# Altium footprint library ICs And Semiconductors THD.PcbLib: 507 footprints (part 9 of 32)
Each footprint in its own frame and in the unit in brackets; x right, y up, seen from the top. Pads: shape width x height; smd on the part's side, far side on the other; paste and mask are expansions set on the pad; w line width, h text height; cw(c..) or ccw(c..) is an arc to the next point about the centre after c.
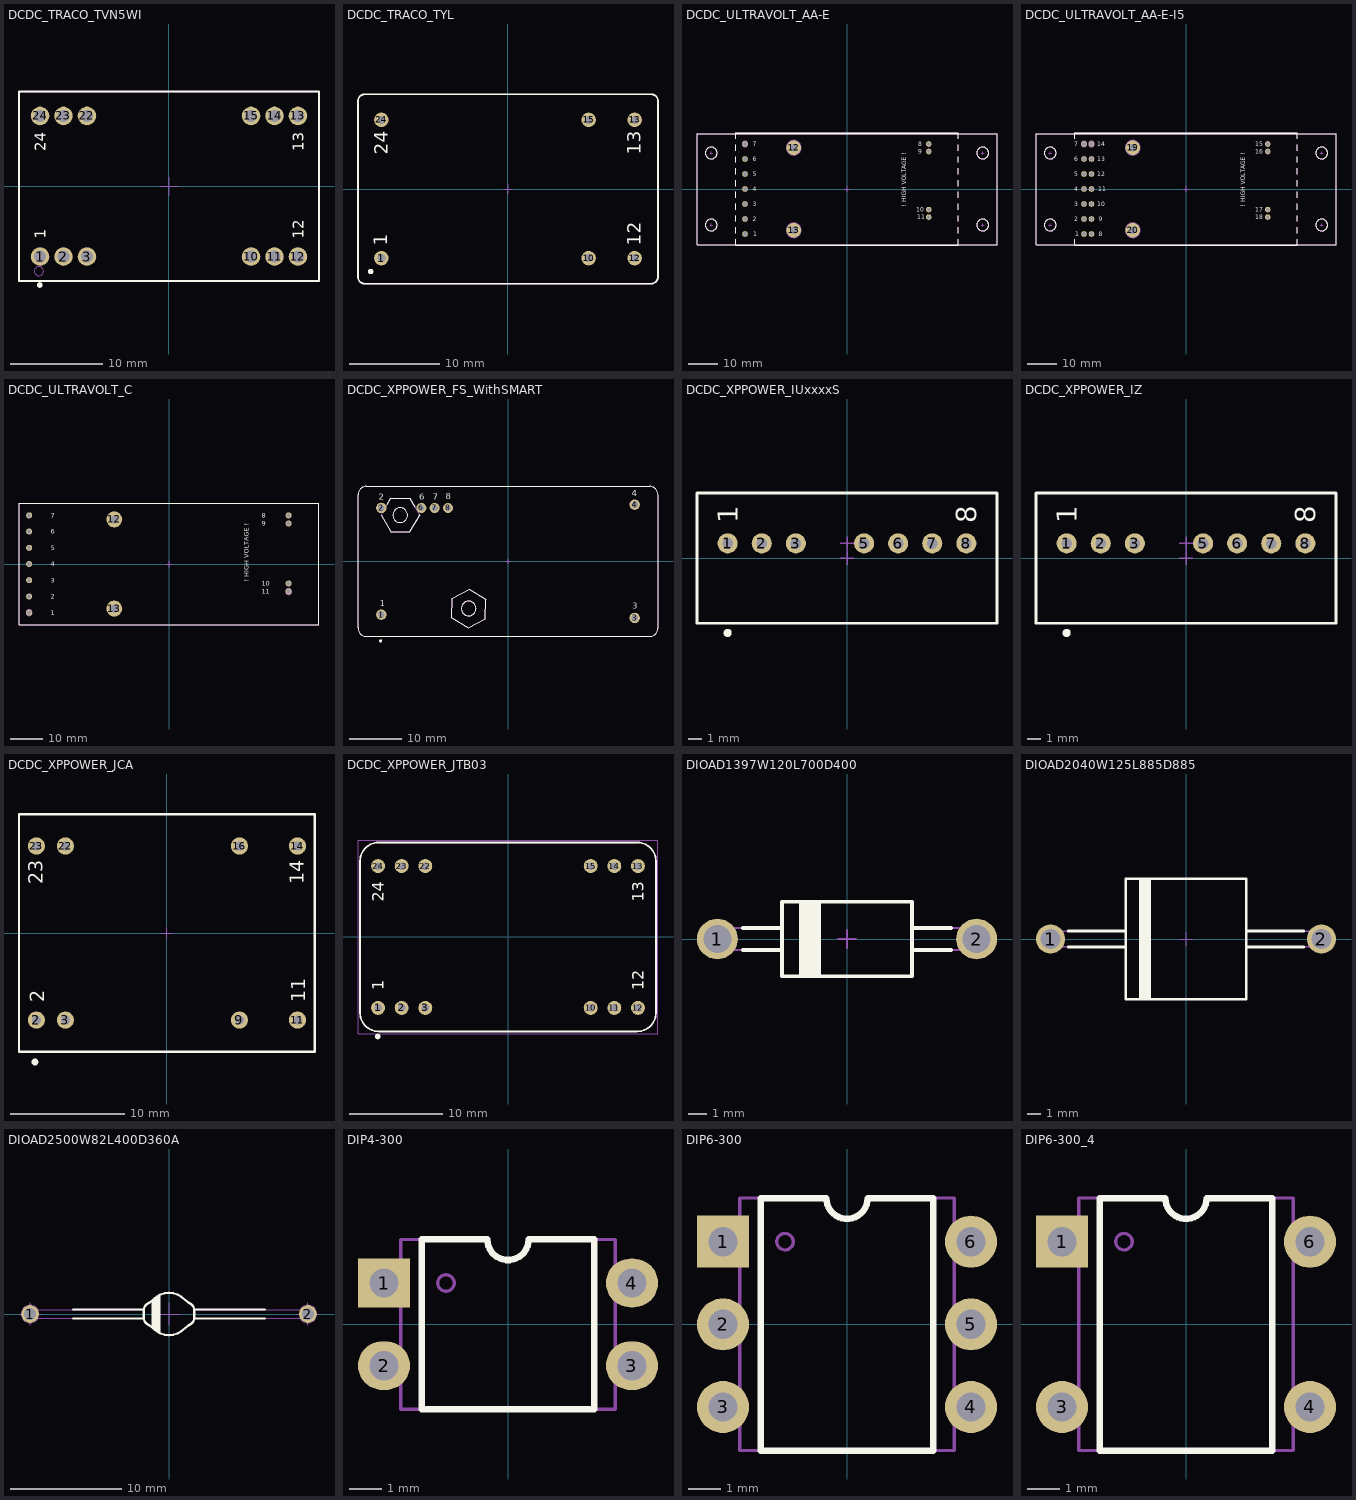
[diagram p8: the footprints below, top view; thin cyan lines are the x and y axes]

## DCDC_TRACO_TVN5WI [mm] "TVN  5WI Series , Body 32x20mm, Pitch 2.54mm"
height 10.7
pads (12):
  round 2 hole 1.3: 1(-13.97,-7.62) 2(-11.43,-7.62) 3(-8.89,-7.62) 10(8.89,-7.62) 11(11.43,-7.62) 12(13.97,-7.62) 13(13.97,7.62) 14(11.43,7.62) 15(8.89,7.62) 22(-8.89,7.62) 23(-11.43,7.62) 24(-13.97,7.62)
Top Overlay:
  circle w0.3: c-14,-10.7 r0.15
  lines w0.2: -16.25,-10.25 -16.25,10.25 16.25,10.25 16.25,-10.25 -16.25,-10.25
  text "1" at -13.335,-5.715 h1.2
  text "13" at 14.605,3.81 h1.2
  text "24" at -13.335,3.81 h1.2
  text "12" at 14.605,-5.715 h1.2
Notvisible:
  lines w0.1: -14.97,-7.62 -13.97,-7.62 ; -14.97,7.62 -13.97,7.62 ; -13.97,-8.62 -13.97,-7.62 ; -13.97,-6.62 -13.97,-7.62 ; -13.97,6.62 -13.97,7.62 ; -13.97,8.62 -13.97,7.62 ; -12.97,-7.62 -13.97,-7.62 ; -12.97,7.62 -13.97,7.62 ; -12.43,-7.62 -11.43,-7.62 ; -12.43,7.62 -11.43,7.62 ; -11.43,-8.62 -11.43,-7.62 ; -11.43,-6.62 -11.43,-7.62 ; -11.43,6.62 -11.43,7.62 ; -11.43,8.62 -11.43,7.62 ; -10.43,-7.62 -11.43,-7.62 ; -10.43,7.62 -11.43,7.62 ; -9.89,-7.62 -8.89,-7.62 ; -9.89,7.62 -8.89,7.62 ; -8.89,-8.62 -8.89,-7.62 ; -8.89,-6.62 -8.89,-7.62 ; -8.89,6.62 -8.89,7.62 ; -8.89,8.62 -8.89,7.62 ; -7.89,-7.62 -8.89,-7.62 ; -7.89,7.62 -8.89,7.62 ; -1,0 0,0 ; 0,-1 0,0 ; 0,1 0,0 ; 1,0 0,0 ; 7.89,-7.62 8.89,-7.62 ; 7.89,7.62 8.89,7.62 ; 8.89,-8.62 8.89,-7.62 ; 8.89,-6.62 8.89,-7.62 ; 8.89,6.62 8.89,7.62 ; 8.89,8.62 8.89,7.62 ; 9.89,-7.62 8.89,-7.62 ; 9.89,7.62 8.89,7.62 ; 10.43,-7.62 11.43,-7.62 ; 10.43,7.62 11.43,7.62 ; 11.43,-8.62 11.43,-7.62 ; 11.43,-6.62 11.43,-7.62 ; 11.43,6.62 11.43,7.62 ; 11.43,8.62 11.43,7.62 ; 12.43,-7.62 11.43,-7.62 ; 12.43,7.62 11.43,7.62 ; 12.97,-7.62 13.97,-7.62 ; 12.97,7.62 13.97,7.62 ; 13.97,-8.62 13.97,-7.62 ; 13.97,-6.62 13.97,-7.62 ; 13.97,6.62 13.97,7.62 ; 13.97,8.62 13.97,7.62 ; 14.97,-7.62 13.97,-7.62 ; 14.97,7.62 13.97,7.62
Mechanical 14:
  circle w0.1: c-14.095,-9.205 r0.5
  lines w0.1: -16.25,-10.25 -16.25,10.25 16.25,10.25 16.25,-10.25 -16.25,-10.25
  text "1" at -13.335,-5.715 h1.2
  text "12" at 14.605,-5.715 h1.2
  text "13" at 14.605,3.81 h1.2
  text "24" at -13.335,3.81 h1.2
3D body "DCDC_TRACO_TVN5WI.stp": height 10.7, standoff -3.8, extent -16.25,-10.25 16.25,10.25

## DCDC_TRACO_TYL [mm] "TYL Series , Body 32.6x20.4mm"
height 10.8
pads (6):
  round 1.6 hole 0.9: 1(-13.97,-7.62) 10(8.89,-7.62) 12(13.97,-7.62) 13(13.97,7.62) 15(8.89,7.62) 24(-13.97,7.62)
Top Overlay:
  circle w0.3: c-15.15,-9.1 r0.15
  lines w0.2: -16.55,-9.7 ccw(c-15.8,-9.7) -15.8,-10.45 15.8,-10.45 ccw(c15.8,-9.7) 16.55,-9.7 16.55,9.7 ccw(c15.8,9.7) 15.8,10.45 -15.8,10.45 ccw(c-15.8,9.7) -16.55,9.7 -16.55,-9.7
  text "24" at -13.29,3.769 h1.5
  text "1" at -13.32,-6.251 h1.5
  text "13" at 14.65,3.769 h1.5
  text "12" at 14.62,-6.251 h1.5
Notvisible:
  lines w0.1: -14.47,-7.62 -13.97,-7.62 ; -14.47,7.62 -13.97,7.62 ; -13.97,-8.12 -13.97,-7.62 ; -13.97,-7.12 -13.97,-7.62 ; -13.97,7.12 -13.97,7.62 ; -13.97,8.12 -13.97,7.62 ; -13.47,-7.62 -13.97,-7.62 ; -13.47,7.62 -13.97,7.62 ; -0.5,0 0,0 ; 0,-0.5 0,0 ; 0,0.5 0,0 ; 0.5,0 0,0 ; 8.39,-7.62 8.89,-7.62 ; 8.39,7.62 8.89,7.62 ; 8.89,-8.12 8.89,-7.62 ; 8.89,-7.12 8.89,-7.62 ; 8.89,7.12 8.89,7.62 ; 8.89,8.12 8.89,7.62 ; 9.39,-7.62 8.89,-7.62 ; 9.39,7.62 8.89,7.62 ; 13.47,-7.62 13.97,-7.62 ; 13.47,7.62 13.97,7.62 ; 13.97,-8.12 13.97,-7.62 ; 13.97,-7.12 13.97,-7.62 ; 13.97,7.12 13.97,7.62 ; 13.97,8.12 13.97,7.62 ; 14.47,-7.62 13.97,-7.62 ; 14.47,7.62 13.97,7.62
Mechanical 14:
  lines w0.1: -16.55,-9.7 ccw(c-15.8,-9.7) -15.8,-10.45 15.8,-10.45 ccw(c15.8,-9.7) 16.55,-9.7 16.55,9.7 ccw(c15.8,9.7) 15.8,10.45 -15.8,10.45 ccw(c-15.8,9.7) -16.55,9.7 -16.55,-9.7
  text "24" at -13.29,3.769 h1.5
  text "1" at -13.32,-6.251 h1.5
  text "13" at 14.65,3.769 h1.5
  text "12" at 14.62,-6.251 h1.5
3D body "DCDC_TRACO_TYL.stp": height 10.8, standoff -3.6, extent -16.55,-10.45 16.55,10.45

## DCDC_ULTRAVOLT_AA-E [mm] "ULTRAVOLT AA Series, DC-DC Converter, with 'Eared' Heat Sink Plate, Body 75.4x38.1mm"
height 22.2
pads (13):
  round 1.9 hole 1.2: 1(-34.544,-15.24) 2(-34.544,-10.16) 3(-34.544,-5.08) 4(-34.544,0) 5(-34.544,5.08) 6(-34.544,10.16) 7(-34.544,15.24) 8(27.686,15.24) 9(27.686,12.7) 10(27.686,-6.985) 11(27.686,-9.525)
  round 5 hole 2.5: 12(-18.034,13.97) 13(-18.034,-13.97)
Top Overlay:
  circle w0.2: c-45.974,-12.192 r1.981
  circle w0.2: c45.974,12.192 r1.981
  circle w0.2: c45.974,-12.192 r1.981
  circle w0.2: c-45.974,12.192 r1.981
  lines w0.2: -37.719,-17 -37.719,-19.05 37.719,-19.05 37.719,-17 ; -37.719,-15 -37.719,-13 ; -37.719,-11 -37.719,-9 ; -37.719,-7 -37.719,-5 ; -37.719,-3 -37.719,-1 ; -37.719,1 -37.719,3 ; -37.719,5 -37.719,7 ; -37.719,9 -37.719,11 ; -37.719,13 -37.719,15 ; -37.719,17 -37.719,19.05 37.719,19.05 37.719,17 ; 37.719,-15 37.719,-13 ; 37.719,-11 37.719,-9 ; 37.719,-7 37.719,-5 ; 37.719,-3 37.719,-1 ; 37.719,1 37.719,3 ; 37.719,5 37.719,7 ; 37.719,9 37.719,11 ; 37.719,13 37.719,15 ; -50.8,-18.796 -50.8,18.796 50.8,18.796 50.8,-18.796 -50.8,-18.796
  text "! HIGH VOLTAGE !" at 20,-6 h1.5
  text "11" at 23.8,-10.275 h1.5
  text "10" at 23.5,-7.735 h1.5
  text "9" at 24.1,11.95 h1.5
  text "8" at 24.1,14.49 h1.5
  text "7" at -32,14.49 h1.5
  text "6" at -32,9.41 h1.5
  text "5" at -32,4.33 h1.5
  text "4" at -32,-0.75 h1.5
  text "3" at -32,-5.83 h1.5
  text "2" at -32,-10.91 h1.5
  text "1" at -31.7,-15.99 h1.5
Notvisible:
  circle w0.05: c-18.034,13.97 r1.1
  circle w0.05: c-18.034,-13.97 r1.1
  circle w0.05: c-34.544,15.24 r0.95
  circle w0.05: c-34.544,15.24 r0.6
  lines w0.05: -46.474,-12.192 -45.974,-12.192 ; -46.474,12.192 -45.974,12.192 ; -45.974,-12.692 -45.974,-12.192 ; -45.974,-11.692 -45.974,-12.192 ; -45.974,11.692 -45.974,12.192 ; -45.974,12.692 -45.974,12.192 ; -45.474,-12.192 -45.974,-12.192 ; -45.474,12.192 -45.974,12.192 ; -35.044,-15.24 -34.544,-15.24 ; -35.044,-10.16 -34.544,-10.16 ; -35.044,-5.08 -34.544,-5.08 ; -35.044,0 -34.544,0 ; -35.044,5.08 -34.544,5.08 ; -35.044,10.16 -34.544,10.16 ; -35.044,15.24 -34.544,15.24 ; -34.544,-15.74 -34.544,-15.24 ; -34.544,-14.74 -34.544,-15.24 ; -34.544,-10.66 -34.544,-10.16 ; -34.544,-9.66 -34.544,-10.16 ; -34.544,-5.58 -34.544,-5.08 ; -34.544,-4.58 -34.544,-5.08 ; -34.544,-0.5 -34.544,0 ; -34.544,0.5 -34.544,0 ; -34.544,4.58 -34.544,5.08 ; -34.544,5.58 -34.544,5.08 ; -34.544,9.66 -34.544,10.16 ; -34.544,10.66 -34.544,10.16 ; -34.544,14.74 -34.544,15.24 ; -34.544,15.74 -34.544,15.24 ; -34.044,-15.24 -34.544,-15.24 ; -34.044,-10.16 -34.544,-10.16 ; -34.044,-5.08 -34.544,-5.08 ; -34.044,0 -34.544,0 ; -34.044,5.08 -34.544,5.08 ; -34.044,10.16 -34.544,10.16 ; -34.044,15.24 -34.544,15.24 ; -18.534,-13.97 -18.034,-13.97 ; -18.534,13.97 -18.034,13.97 ; -18.034,-14.47 -18.034,-13.97 ; -18.034,-13.47 -18.034,-13.97 ; -18.034,13.47 -18.034,13.97 ; -18.034,14.47 -18.034,13.97 ; -17.534,-13.97 -18.034,-13.97 ; -17.534,13.97 -18.034,13.97 ; -1,0 1,0 ; 0,-1 0,1 ; 27.186,-9.525 27.686,-9.525 ; 27.186,-6.985 27.686,-6.985 ; 27.186,12.7 27.686,12.7 ; 27.186,15.24 27.686,15.24 ; 27.686,-10.025 27.686,-9.525 ; 27.686,-9.025 27.686,-9.525 ; 27.686,-7.485 27.686,-6.985 ; 27.686,-6.485 27.686,-6.985 ; 27.686,12.2 27.686,12.7 ; 27.686,13.2 27.686,12.7 ; 27.686,14.74 27.686,15.24 ; 27.686,15.74 27.686,15.24 ; 28.186,-9.525 27.686,-9.525 ; 28.186,-6.985 27.686,-6.985 ; 28.186,12.7 27.686,12.7 ; 28.186,15.24 27.686,15.24 ; 45.474,-12.192 45.974,-12.192 ; 45.474,12.192 45.974,12.192 ; 45.974,-12.692 45.974,-12.192 ; 45.974,-11.692 45.974,-12.192 ; 45.974,11.692 45.974,12.192 ; 45.974,12.692 45.974,12.192 ; 46.474,-12.192 45.974,-12.192 ; 46.474,12.192 45.974,12.192
Mechanical 14:
  circle w0.1: c-18.034,-13.97 r2.35
  circle w0.1: c-18.034,13.97 r2.35
  circle w0.1: c45.974,12.192 r1.981
  circle w0.1: c45.974,-12.192 r1.981
  circle w0.1: c-45.974,-12.192 r1.981
  circle w0.1: c-45.974,12.192 r1.981
  circle w0.1: c-18.034,13.97 r2.5
  circle w0.1: c-18.034,-13.97 r2.5
  lines w0.1: -37.719,-17 -37.719,-19.05 37.719,-19.05 37.719,-17 ; -37.719,-15 -37.719,-13 ; -37.719,-11 -37.719,-9 ; -37.719,-7 -37.719,-5 ; -37.719,-3 -37.719,-1 ; -37.719,1 -37.719,3 ; -37.719,5 -37.719,7 ; -37.719,9 -37.719,11 ; -37.719,13 -37.719,15 ; -37.719,17 -37.719,19.05 37.719,19.05 37.719,17 ; 37.719,-15 37.719,-13 ; 37.719,-11 37.719,-9 ; 37.719,-7 37.719,-5 ; 37.719,-3 37.719,-1 ; 37.719,1 37.719,3 ; 37.719,5 37.719,7 ; 37.719,9 37.719,11 ; 37.719,13 37.719,15 ; -50.8,-18.796 -50.8,18.796 50.8,18.796 50.8,-18.796 -50.8,-18.796
  text "11" at 23.8,-10.275 h1.5
  text "10" at 23.5,-7.735 h1.5
  text "9" at 24.1,11.95 h1.5
  text "8" at 24.1,14.49 h1.5
  text "7" at -32,14.49 h1.5
  text "6" at -32,9.41 h1.5
  text "5" at -32,4.33 h1.5
  text "4" at -32,-0.75 h1.5
  text "3" at -32,-5.83 h1.5
  text "2" at -32,-10.91 h1.5
  text "1" at -31.7,-15.99 h1.5
3D body "DCDC_ULTRAVOLT_AA-E.stp": height 22.2, standoff -3.5, extent -50.8,-19.05 50.8,19.05

## DCDC_ULTRAVOLT_AA-E-I5 [mm] "ULTRAVOLT AA Series, DC-DC Converter, with 'Eared' Heat Sink Plate and I5 Interface, Body 75.4x38.1mm"
height 22.2
pads (20):
  round 1.9 hole 1.2: 1(-34.544,-15.24) 2(-34.544,-10.16) 3(-34.544,-5.08) 4(-34.544,0) 5(-34.544,5.08) 6(-34.544,10.16) 7(-34.544,15.24) 8(-32.004,-15.24) 9(-32.004,-10.16) 10(-32.004,-5.08) 11(-32.004,0) 12(-32.004,5.08) 13(-32.004,10.16) 14(-32.004,15.24) 15(27.686,15.24) 16(27.686,12.7) 17(27.686,-6.985) 18(27.686,-9.525)
  round 5 hole 2.5: 19(-18.034,13.97) 20(-18.034,-13.97)
Top Overlay:
  circle w0.2: c-45.974,12.192 r1.981
  circle w0.2: c45.974,-12.192 r1.981
  circle w0.2: c45.974,12.192 r1.981
  circle w0.2: c-45.974,-12.192 r1.981
  lines w0.2: -37.719,-17 -37.719,-19.05 37.719,-19.05 37.719,-17 ; -37.719,17 -37.719,19.05 37.719,19.05 37.719,17 ; 37.719,-15 37.719,-13 ; 37.719,-11 37.719,-9 ; 37.719,-7 37.719,-5 ; 37.719,-3 37.719,-1 ; 37.719,1 37.719,3 ; 37.719,5 37.719,7 ; 37.719,9 37.719,11 ; 37.719,13 37.719,15 ; -50.8,-18.796 50.8,-18.796 50.8,18.796 -50.8,18.796 -50.8,-18.796
  text "8" at -29.5,-15.99 h1.5
  text "9" at -29.5,-10.91 h1.5
  text "10" at -30,-5.83 h1.5
  text "11" at -29.7,-0.75 h1.5
  text "12" at -30,4.33 h1.5
  text "13" at -30,9.41 h1.5
  text "14" at -30.1,14.49 h1.5
  text "1" at -37.5,-15.99 h1.5
  text "2" at -37.8,-10.91 h1.5
  text "3" at -37.8,-5.83 h1.5
  text "4" at -37.8,-0.75 h1.5
  text "5" at -37.8,4.33 h1.5
  text "6" at -37.8,9.41 h1.5
  text "7" at -37.8,14.49 h1.5
  text "15" at 23.5,14.49 h1.5
  text "16" at 23.5,11.95 h1.5
  text "17" at 23.5,-7.735 h1.5
  text "18" at 23.5,-10.275 h1.5
  text "! HIGH VOLTAGE !" at 20,-6 h1.5
Notvisible:
  circle w0.1: c-32.004,15.24 r0.6
  circle w0.1: c-32.004,15.24 r0.95
  circle w0.05: c-34.544,15.24 r0.6
  circle w0.05: c-34.544,15.24 r0.95
  circle w0.05: c-18.034,-13.97 r1.1
  circle w0.05: c-18.034,13.97 r1.1
  lines w0.05: -46.474,-12.192 -45.974,-12.192 ; -46.474,12.192 -45.974,12.192 ; -45.974,-12.692 -45.974,-12.192 ; -45.974,-11.692 -45.974,-12.192 ; -45.974,11.692 -45.974,12.192 ; -45.974,12.692 -45.974,12.192 ; -45.474,-12.192 -45.974,-12.192 ; -45.474,12.192 -45.974,12.192 ; -35.044,-15.24 -34.544,-15.24 ; -35.044,-10.16 -34.544,-10.16 ; -35.044,-5.08 -34.544,-5.08 ; -35.044,0 -34.544,0 ; -35.044,5.08 -34.544,5.08 ; -35.044,10.16 -34.544,10.16 ; -35.044,15.24 -34.544,15.24 ; -34.544,-15.74 -34.544,-15.24 ; -34.544,-14.74 -34.544,-15.24 ; -34.544,-10.66 -34.544,-10.16 ; -34.544,-9.66 -34.544,-10.16 ; -34.544,-5.58 -34.544,-5.08 ; -34.544,-4.58 -34.544,-5.08 ; -34.544,-0.5 -34.544,0 ; -34.544,0.5 -34.544,0 ; -34.544,4.58 -34.544,5.08 ; -34.544,5.58 -34.544,5.08 ; -34.544,9.66 -34.544,10.16 ; -34.544,10.66 -34.544,10.16 ; -34.544,14.74 -34.544,15.24 ; -34.544,15.74 -34.544,15.24 ; -34.044,-15.24 -34.544,-15.24 ; -34.044,-10.16 -34.544,-10.16 ; -34.044,-5.08 -34.544,-5.08 ; -34.044,0 -34.544,0 ; -34.044,5.08 -34.544,5.08 ; -34.044,10.16 -34.544,10.16 ; -34.044,15.24 -34.544,15.24 ; -18.534,-13.97 -18.034,-13.97 ; -18.534,13.97 -18.034,13.97 ; -18.034,-14.47 -18.034,-13.97 ; -18.034,-13.47 -18.034,-13.97 ; -18.034,13.47 -18.034,13.97 ; -18.034,14.47 -18.034,13.97 ; -17.534,-13.97 -18.034,-13.97 ; -17.534,13.97 -18.034,13.97 ; -1,0 1,0 ; 0,-1 0,1 ; 27.186,-9.525 27.686,-9.525 ; 27.186,-6.985 27.686,-6.985 ; 27.186,12.7 27.686,12.7 ; 27.186,15.24 27.686,15.24 ; 27.686,-10.025 27.686,-9.525 ; 27.686,-9.025 27.686,-9.525 ; 27.686,-7.485 27.686,-6.985 ; 27.686,-6.485 27.686,-6.985 ; 27.686,12.2 27.686,12.7 ; 27.686,13.2 27.686,12.7 ; 27.686,14.74 27.686,15.24 ; 27.686,15.74 27.686,15.24 ; 28.186,-9.525 27.686,-9.525 ; 28.186,-6.985 27.686,-6.985 ; 28.186,12.7 27.686,12.7 ; 28.186,15.24 27.686,15.24 ; 45.474,-12.192 45.974,-12.192 ; 45.474,12.192 45.974,12.192 ; 45.974,-12.692 45.974,-12.192 ; 45.974,-11.692 45.974,-12.192 ; 45.974,11.692 45.974,12.192 ; 45.974,12.692 45.974,12.192 ; 46.474,-12.192 45.974,-12.192 ; 46.474,12.192 45.974,12.192
  lines w0.1: -32.504,-15.24 -32.004,-15.24 ; -32.504,-10.16 -32.004,-10.16 ; -32.504,-5.08 -32.004,-5.08 ; -32.504,0 -32.004,0 ; -32.504,5.08 -32.004,5.08 ; -32.504,10.16 -32.004,10.16 ; -32.504,15.24 -32.004,15.24 ; -32.004,-15.74 -32.004,-15.24 ; -32.004,-14.74 -32.004,-15.24 ; -32.004,-10.66 -32.004,-10.16 ; -32.004,-9.66 -32.004,-10.16 ; -32.004,-5.58 -32.004,-5.08 ; -32.004,-4.58 -32.004,-5.08 ; -32.004,-0.5 -32.004,0 ; -32.004,0.5 -32.004,0 ; -32.004,4.58 -32.004,5.08 ; -32.004,5.58 -32.004,5.08 ; -32.004,9.66 -32.004,10.16 ; -32.004,10.66 -32.004,10.16 ; -32.004,14.74 -32.004,15.24 ; -32.004,15.74 -32.004,15.24 ; -31.504,-15.24 -32.004,-15.24 ; -31.504,-10.16 -32.004,-10.16 ; -31.504,-5.08 -32.004,-5.08 ; -31.504,0 -32.004,0 ; -31.504,5.08 -32.004,5.08 ; -31.504,10.16 -32.004,10.16 ; -31.504,15.24 -32.004,15.24
Mechanical 14:
  circle w0.1: c-18.034,-13.97 r2.5
  circle w0.1: c-18.034,13.97 r2.5
  circle w0.1: c-45.974,12.192 r1.981
  circle w0.1: c-45.974,-12.192 r1.981
  circle w0.1: c45.974,-12.192 r1.981
  circle w0.1: c45.974,12.192 r1.981
  circle w0.1: c-18.034,13.97 r2.35
  circle w0.1: c-18.034,-13.97 r2.35
  lines w0.1: -37.719,-17 -37.719,-19.05 37.719,-19.05 37.719,-17 ; -37.719,17 -37.719,19.05 37.719,19.05 37.719,17 ; 37.719,-15 37.719,-13 ; 37.719,-11 37.719,-9 ; 37.719,-7 37.719,-5 ; 37.719,-3 37.719,-1 ; 37.719,1 37.719,3 ; 37.719,5 37.719,7 ; 37.719,9 37.719,11 ; 37.719,13 37.719,15 ; -50.8,-18.796 50.8,-18.796 50.8,18.796 -50.8,18.796 -50.8,-18.796
  text "8" at -29.5,-15.99 h1.5
  text "9" at -29.5,-10.91 h1.5
  text "10" at -30,-5.83 h1.5
  text "11" at -29.7,-0.75 h1.5
  text "12" at -30,4.33 h1.5
  text "13" at -30,9.41 h1.5
  text "14" at -30.1,14.49 h1.5
  text "1" at -37.5,-15.99 h1.5
  text "2" at -37.8,-10.91 h1.5
  text "3" at -37.8,-5.83 h1.5
  text "4" at -37.8,-0.75 h1.5
  text "5" at -37.8,4.33 h1.5
  text "6" at -37.8,9.41 h1.5
  text "7" at -37.8,14.49 h1.5
  text "15" at 23.5,14.49 h1.5
  text "16" at 23.5,11.95 h1.5
  text "17" at 23.5,-7.735 h1.5
  text "18" at 23.5,-10.275 h1.5
3D body "DCDC_ULTRAVOLT_AA-E-I5.stp": height 22.2, standoff -3.5, extent -50.8,-19.05 50.8,19.05

## DCDC_ULTRAVOLT_C [mm] "ULTRAVOLT C Series, DC-DC Converter, Body 94x38.1mm"
height 19.6
pads (13):
  round 1.9 hole 1.2: 1(-43.815,-15.24) 2(-43.815,-10.16) 3(-43.815,-5.08) 4(-43.815,0) 5(-43.815,5.08) 6(-43.815,10.16) 7(-43.815,15.24) 8(37.465,15.24) 9(37.465,12.7) 10(37.465,-6.096) 11(37.465,-8.636)
  round 5 hole 2.5: 12(-17.145,13.97) 13(-17.145,-13.97)
Top Overlay:
  lines w0.2: -46.99,-19.05 46.99,-19.05 46.99,19.05 -46.99,19.05 -46.99,-19.05
  text "1" at -37,-15.99 h1.5
  text "2" at -37,-10.91 h1.5
  text "3" at -37,-5.83 h1.5
  text "4" at -37,-0.75 h1.5
  text "5" at -37,4.33 h1.5
  text "6" at -37,9.41 h1.5
  text "7" at -37,14.49 h1.5
  text "8" at 29,14.49 h1.5
  text "9" at 29,11.95 h1.5
  text "10" at 29,-6.846 h1.5
  text "11" at 29,-9.386 h1.5
  text "! HIGH VOLTAGE !" at 25,-5.5 h1.5
Notvisible:
  circle w0.05: c-43.815,-15.24 r0.6
  circle w0.05: c-43.815,-15.24 r0.95
  circle w0.05: c37.465,-8.636 r0.6
  circle w0.05: c37.465,-8.636 r0.95
  lines w0.05: -44.315,-15.24 -43.815,-15.24 ; -44.315,-10.16 -43.815,-10.16 ; -44.315,-5.08 -43.815,-5.08 ; -44.315,0 -43.815,0 ; -44.315,5.08 -43.815,5.08 ; -44.315,10.16 -43.815,10.16 ; -44.315,15.24 -43.815,15.24 ; -43.815,-15.74 -43.815,-15.24 ; -43.815,-14.74 -43.815,-15.24 ; -43.815,-10.66 -43.815,-10.16 ; -43.815,-9.66 -43.815,-10.16 ; -43.815,-5.58 -43.815,-5.08 ; -43.815,-4.58 -43.815,-5.08 ; -43.815,-0.5 -43.815,0 ; -43.815,0.5 -43.815,0 ; -43.815,4.58 -43.815,5.08 ; -43.815,5.58 -43.815,5.08 ; -43.815,9.66 -43.815,10.16 ; -43.815,10.66 -43.815,10.16 ; -43.815,14.74 -43.815,15.24 ; -43.815,15.74 -43.815,15.24 ; -43.315,-15.24 -43.815,-15.24 ; -43.315,-10.16 -43.815,-10.16 ; -43.315,-5.08 -43.815,-5.08 ; -43.315,0 -43.815,0 ; -43.315,5.08 -43.815,5.08 ; -43.315,10.16 -43.815,10.16 ; -43.315,15.24 -43.815,15.24 ; -17.645,-13.97 -17.145,-13.97 ; -17.645,13.97 -17.145,13.97 ; -17.145,-14.47 -17.145,-13.97 ; -17.145,-13.47 -17.145,-13.97 ; -17.145,13.47 -17.145,13.97 ; -17.145,14.47 -17.145,13.97 ; -16.645,-13.97 -17.145,-13.97 ; -16.645,13.97 -17.145,13.97 ; -1,0 1,0 ; 0,-1 0,1 ; 36.965,-8.636 37.465,-8.636 ; 36.965,-6.096 37.465,-6.096 ; 36.965,12.7 37.465,12.7 ; 36.965,15.24 37.465,15.24 ; 37.465,-9.136 37.465,-8.636 ; 37.465,-8.136 37.465,-8.636 ; 37.465,-6.596 37.465,-6.096 ; 37.465,-5.596 37.465,-6.096 ; 37.465,12.2 37.465,12.7 ; 37.465,13.2 37.465,12.7 ; 37.465,14.74 37.465,15.24 ; 37.465,15.74 37.465,15.24 ; 37.965,-8.636 37.465,-8.636 ; 37.965,-6.096 37.465,-6.096 ; 37.965,12.7 37.465,12.7 ; 37.965,15.24 37.465,15.24
Mechanical 14:
  lines w0.2: -46.99,-19.05 46.99,-19.05 46.99,19.05 -46.99,19.05 -46.99,-19.05
  text "1" at -37,-15.99 h1.5
  text "2" at -37,-10.91 h1.5
  text "3" at -37,-5.83 h1.5
  text "4" at -37,-0.75 h1.5
  text "5" at -37,4.33 h1.5
  text "6" at -37,9.41 h1.5
  text "7" at -37,14.49 h1.5
  text "8" at 29,14.49 h1.5
  text "9" at 29,11.95 h1.5
  text "10" at 29,-6.846 h1.5
  text "11" at 29,-9.386 h1.5
  text "! HIGH VOLTAGE !" at 25,-5.5 h1.5
3D body "DCDC_ULTRAVOLT_C.stp": height 19.56, standoff -3.8, extent -46.99,-19.05 46.99,19.05

## DCDC_XPPOWER_FS_WithSMART [mm] "FS Series, Body 57.2x28.5mm"
height 12.7
pads (7):
  round 2 hole 1.3: 1(-24.13,-10.147) 2(-24.13,10.173) 3(24.13,-10.782) 4(24.13,10.808)
  round 1.9 hole 1.2: 6(-16.51,10.173) 7(-13.97,10.173) 8(-11.43,10.173)
Top Overlay:
  circle w0.2: c-20.523,8.801 r1.397
  circle w0.2: c-7.493,-8.979 r1.397
  circle w0.3: c-24.265,-15.142 r0.15
  lines w0.2: -24.176,8.824 -24.189,8.801 -22.356,5.626 -18.69,5.626 -16.857,8.801 -16.941,8.946 ; -22.985,10.888 -22.356,11.976 -18.69,11.976 -17.788,10.413 ; -28.575,-12.687 ccw(c-26.975,-12.687) -26.975,-14.287 26.975,-14.287 ccw(c26.975,-12.687) 28.575,-12.687 28.575,12.687 ccw(c26.975,12.687) 26.975,14.287 -26.975,14.287 ccw(c-26.975,12.687) -28.575,12.687 -28.575,-12.687 ; -10.727,-10.705 -7.615,-12.643 -4.381,-10.917 -4.259,-7.252 -7.371,-5.315 -10.605,-7.041 -10.727,-10.705
  text "1" at -24.39,-8.565 h1.2
  text "2" at -24.645,11.78 h1.2
  text "6" at -16.895,11.755 h1.2
  text "7" at -14.355,11.78 h1.2
  text "8" at -11.865,11.805 h1.2
  text "4" at 23.62,12.39 h1.2
  text "3" at 23.69,-9.068 h1.2
Notvisible:
  circle w0.05: c-16.51,10.173 r0.6
  circle w0.05: c-13.97,10.173 r0.6
  circle w0.05: c-11.43,10.173 r0.6
  circle w0.05: c-24.13,10.173 r0.65
  circle w0.05: c-24.13,-10.147 r0.65
  circle w0.05: c24.13,-10.782 r0.65
  circle w0.05: c24.13,10.808 r0.65
  lines w0.05: -24.63,-10.147 -24.13,-10.147 ; -24.63,10.173 -24.13,10.173 ; -24.13,-10.647 -24.13,-10.147 ; -24.13,-9.647 -24.13,-10.147 ; -24.13,9.673 -24.13,10.173 ; -24.13,10.673 -24.13,10.173 ; -23.63,-10.147 -24.13,-10.147 ; -23.63,10.173 -24.13,10.173 ; -17.01,10.173 -16.51,10.173 ; -16.51,9.673 -16.51,10.173 ; -16.51,10.673 -16.51,10.173 ; -16.01,10.173 -16.51,10.173 ; -14.47,10.173 -13.97,10.173 ; -13.97,9.673 -13.97,10.173 ; -13.97,10.673 -13.97,10.173 ; -13.47,10.173 -13.97,10.173 ; -11.93,10.173 -11.43,10.173 ; -11.43,9.673 -11.43,10.173 ; -11.43,10.673 -11.43,10.173 ; -10.93,10.173 -11.43,10.173 ; -0.5,0 0,0 ; 0,-0.5 0,0 ; 0,0.5 0,0 ; 0.5,0 0,0 ; 23.63,-10.782 24.13,-10.782 ; 23.63,10.808 24.13,10.808 ; 24.13,-11.282 24.13,-10.782 ; 24.13,-10.282 24.13,-10.782 ; 24.13,10.308 24.13,10.808 ; 24.13,11.308 24.13,10.808 ; 24.63,-10.782 24.13,-10.782 ; 24.63,10.808 24.13,10.808
Mechanical 14:
  circle w0.1: c-20.523,8.801 r1.397
  circle w0.1: c-7.493,-8.979 r1.397
  lines w0.1: -28.575,-12.687 ccw(c-26.975,-12.687) -26.975,-14.287 26.975,-14.287 ccw(c26.975,-12.687) 28.575,-12.687 28.575,12.687 ccw(c26.975,12.687) 26.975,14.287 -26.975,14.287 ccw(c-26.975,12.687) -28.575,12.687 -28.575,-12.687 ; -24.189,8.801 -22.356,5.626 -18.69,5.626 -16.857,8.801 -18.69,11.976 -22.356,11.976 -24.189,8.801 ; -10.727,-10.705 -7.615,-12.643 -4.381,-10.917 -4.259,-7.252 -7.371,-5.315 -10.605,-7.041 -10.727,-10.705
  text "1" at -24.39,-8.565 h1.2
  text "2" at -24.645,11.78 h1.2
  text "6" at -16.895,11.755 h1.2
  text "7" at -14.355,11.78 h1.2
  text "8" at -11.865,11.805 h1.2
  text "4" at 23.62,12.39 h1.2
  text "3" at 23.69,-9.068 h1.2
3D body "DCDC_XPPOWER_FS_WithSMART.stp": height 12.7, standoff -7.62, extent -28.575,-14.287 28.575,14.288

## DCDC_XPPOWER_IUxxxxS [mm] "SIP-8 Package DC-DC Converter, Body 21.85x9.2mm, IU Serie"
height 11.6
pads (7):
  round 1.5 hole 0.8: 1(-8.89,1.1) 2(-6.35,1.1) 3(-3.81,1.1) 5(1.27,1.1) 6(3.81,1.1) 7(6.35,1.1) 8(8.89,1.1)
Top Overlay:
  circle w0.3: c-8.89,-5.567 r0.15
  lines w0.2: -11.175,-4.85 11.175,-4.85 11.175,4.85 -11.175,4.85 -11.175,-4.85
  text "1" at -8.14,2.6 h1.5
  text "8" at 9.64,2.6 h1.5
Notvisible:
  lines w0.1: -9.39,1.1 -8.89,1.1 ; -8.89,0.6 -8.89,1.1 ; -8.89,1.6 -8.89,1.1 ; -8.39,1.1 -8.89,1.1 ; -6.85,1.1 -6.35,1.1 ; -6.35,0.6 -6.35,1.1 ; -6.35,1.6 -6.35,1.1 ; -5.85,1.1 -6.35,1.1 ; -4.31,1.1 -3.81,1.1 ; -3.81,0.6 -3.81,1.1 ; -3.81,1.6 -3.81,1.1 ; -3.31,1.1 -3.81,1.1 ; -0.5,0 0,0 ; -0.5,1.1 0,1.1 ; 0,-0.5 0,0 ; 0,0.5 0,0 ; 0,0.6 0,1.1 ; 0,1.6 0,1.1 ; 0.5,0 0,0 ; 0.5,1.1 0,1.1 ; 0.77,1.1 1.27,1.1 ; 1.27,0.6 1.27,1.1 ; 1.27,1.6 1.27,1.1 ; 1.77,1.1 1.27,1.1 ; 3.31,1.1 3.81,1.1 ; 3.81,0.6 3.81,1.1 ; 3.81,1.6 3.81,1.1 ; 4.31,1.1 3.81,1.1 ; 5.85,1.1 6.35,1.1 ; 6.35,0.6 6.35,1.1 ; 6.35,1.6 6.35,1.1 ; 6.85,1.1 6.35,1.1 ; 8.39,1.1 8.89,1.1 ; 8.89,0.6 8.89,1.1 ; 8.89,1.6 8.89,1.1 ; 9.39,1.1 8.89,1.1
  text "7" at 7.1,2.6 h1.5
  text "6" at 4.56,2.6 h1.5
  text "5" at 2.02,2.6 h1.5
  text "3" at -3.06,2.6 h1.5
  text "2" at -5.6,2.6 h1.5
Mechanical 14:
  lines w0.1: -11.175,-4.85 -11.175,4.85 11.175,4.85 11.175,-4.85 -11.175,-4.85
  text "1" at -8.14,2.6 h1.5
  text "8" at 9.64,2.6 h1.5
3D body "DCDC_XPPOWER_IUxxxxS.stp": height 11.6, standoff -3.05, extent -11.175,-4.85 11.175,4.85

## DCDC_XPPOWER_IZ [mm] "SIP-8 Package DC-DC Converter,Body 21.85x11.1mm, IZ Serie"
height 11.6
pads (7):
  round 1.5 hole 0.8: 1(-8.89,1.1) 2(-6.35,1.1) 3(-3.81,1.1) 5(1.27,1.1) 6(3.81,1.1) 7(6.35,1.1) 8(8.89,1.1)
Top Overlay:
  circle w0.3: c-8.89,-5.567 r0.15
  lines w0.2: -11.175,-4.85 -11.175,4.85 11.175,4.85 11.175,-4.85 -11.175,-4.85
  text "8" at 9.64,2.6 h1.5
  text "1" at -8.14,2.6 h1.5
Notvisible:
  lines w0.1: -9.39,1.1 -8.89,1.1 ; -8.89,0.6 -8.89,1.1 ; -8.89,1.6 -8.89,1.1 ; -8.39,1.1 -8.89,1.1 ; -6.85,1.1 -6.35,1.1 ; -6.35,0.6 -6.35,1.1 ; -6.35,1.6 -6.35,1.1 ; -5.85,1.1 -6.35,1.1 ; -4.31,1.1 -3.81,1.1 ; -3.81,0.6 -3.81,1.1 ; -3.81,1.6 -3.81,1.1 ; -3.31,1.1 -3.81,1.1 ; -0.5,0 0,0 ; -0.5,1.1 0,1.1 ; 0,-0.5 0,0 ; 0,0.5 0,0 ; 0,0.6 0,1.1 ; 0,1.6 0,1.1 ; 0.5,0 0,0 ; 0.5,1.1 0,1.1 ; 0.77,1.1 1.27,1.1 ; 1.27,0.6 1.27,1.1 ; 1.27,1.6 1.27,1.1 ; 1.77,1.1 1.27,1.1 ; 3.31,1.1 3.81,1.1 ; 3.81,0.6 3.81,1.1 ; 3.81,1.6 3.81,1.1 ; 4.31,1.1 3.81,1.1 ; 5.85,1.1 6.35,1.1 ; 6.35,0.6 6.35,1.1 ; 6.35,1.6 6.35,1.1 ; 6.85,1.1 6.35,1.1 ; 8.39,1.1 8.89,1.1 ; 8.89,0.6 8.89,1.1 ; 8.89,1.6 8.89,1.1 ; 9.39,1.1 8.89,1.1
  text "2" at -5.6,2.6 h1.5
  text "3" at -3.06,2.6 h1.5
  text "5" at 2.02,2.6 h1.5
  text "6" at 4.56,2.6 h1.5
  text "7" at 7.1,2.6 h1.5
Mechanical 14:
  lines w0.1: -11.175,-4.85 11.175,-4.85 11.175,4.85 -11.175,4.85 -11.175,-4.85
  text "8" at 9.64,2.6 h1.5
  text "1" at -8.14,2.6 h1.5
3D body "DCDC_XPPOWER_IZ.stp": height 11.6, standoff -3.05, extent -11.175,-4.85 11.175,4.85

## DCDC_XPPOWER_JCA [mm] "JCA10 Series , Body 25.4x20.3mm"
height 10.5
pads (8):
  round 1.5 hole 0.8: 2(-11.43,-7.62) 3(-8.89,-7.62) 9(6.35,-7.62) 11(11.43,-7.62) 14(11.43,7.62) 16(6.35,7.62) 22(-8.89,7.62) 23(-11.43,7.62)
Top Overlay:
  circle w0.3: c-11.558,-11.29 r0.15
  lines w0.2: -12.95,-10.4 12.95,-10.4 12.95,10.4 -12.95,10.4 -12.95,-10.4
  text "2" at -10.745,-6.065 h1.2
  text "23" at -10.865,4.28 h1.2
  text "14" at 11.995,4.28 h1.2
  text "11" at 12.115,-6.065 h1.2
Notvisible:
  lines w0.1: -11.93,-7.62 -11.43,-7.62 ; -11.93,7.62 -11.43,7.62 ; -11.43,-8.12 -11.43,-7.62 ; -11.43,-7.12 -11.43,-7.62 ; -11.43,7.12 -11.43,7.62 ; -11.43,8.12 -11.43,7.62 ; -10.93,-7.62 -11.43,-7.62 ; -10.93,7.62 -11.43,7.62 ; -9.39,-7.62 -8.89,-7.62 ; -9.39,7.62 -8.89,7.62 ; -8.89,-8.12 -8.89,-7.62 ; -8.89,-7.12 -8.89,-7.62 ; -8.89,7.12 -8.89,7.62 ; -8.89,8.12 -8.89,7.62 ; -8.39,-7.62 -8.89,-7.62 ; -8.39,7.62 -8.89,7.62 ; -0.5,0 0,0 ; 0,-0.5 0,0 ; 0,0.5 0,0 ; 0.5,0 0,0 ; 5.85,-7.62 6.35,-7.62 ; 5.85,7.62 6.35,7.62 ; 6.35,-8.12 6.35,-7.62 ; 6.35,-7.12 6.35,-7.62 ; 6.35,7.12 6.35,7.62 ; 6.35,8.12 6.35,7.62 ; 6.85,-7.62 6.35,-7.62 ; 6.85,7.62 6.35,7.62 ; 10.93,-7.62 11.43,-7.62 ; 10.93,7.62 11.43,7.62 ; 11.43,-8.12 11.43,-7.62 ; 11.43,-7.12 11.43,-7.62 ; 11.43,7.12 11.43,7.62 ; 11.43,8.12 11.43,7.62 ; 11.93,-7.62 11.43,-7.62 ; 11.93,7.62 11.43,7.62
Mechanical 14:
  lines w0.1: -12.95,-10.4 12.95,-10.4 12.95,10.4 -12.95,10.4 -12.95,-10.4
  text "2" at -10.745,-6.065 h1.2
  text "23" at -10.865,4.28 h1.2
  text "14" at 11.995,4.28 h1.2
  text "11" at 12.115,-6.065 h1.2
3D body "DCDC_XPPOWER_JCA.stp": height 10.5, standoff -3.8, extent -12.95,-10.4 12.95,10.4

## DCDC_XPPOWER_JTB03 [mm] "JTB03 Series , Body 31.8x20.3mm, Pitch 2.54mm"
height 10.2
pads (12):
  round 1.5 hole 0.8: 1(-13.97,-7.62) 2(-11.43,-7.62) 3(-8.89,-7.62) 10(8.89,-7.62) 11(11.43,-7.62) 12(13.97,-7.62) 13(13.97,7.62) 14(11.43,7.62) 15(8.89,7.62) 22(-8.89,7.62) 23(-11.43,7.62) 24(-13.97,7.62)
Top Overlay:
  circle w0.3: c-14,-10.7 r0.15
  lines w0.2: -15.9,-8.15 ccw(c-13.9,-8.15) -13.9,-10.15 13.9,-10.15 ccw(c13.9,-8.15) 15.9,-8.15 15.9,8.15 ccw(c13.9,8.15) 13.9,10.15 -13.9,10.15 ccw(c-13.9,8.15) -15.9,8.15 -15.9,-8.15
  text "12" at 14.605,-5.715 h1.27
  text "24" at -13.335,3.81 h1.27
  text "13" at 14.605,3.81 h1.27
  text "1" at -13.335,-5.715 h1.27
Mechanical 14:
  lines w0.1: -15.9,-8.15 ccw(c-13.9,-8.15) -13.9,-10.15 ; -15.9,-8.15 ccw(c-13.9,-8.15) -13.9,-10.15 ; -15.9,-8.15 ccw(c-13.9,-8.15) -13.9,-10.15 ; -15.9,-8.15 -15.9,8.15 ; -15.9,-8.15 -15.9,8.15 ; -15.9,-8.15 -15.9,8.15 ; -15.9,8.15 cw(c-13.9,8.15) -13.9,10.15 ; -15.9,8.15 cw(c-13.9,8.15) -13.9,10.15 ; -15.9,8.15 cw(c-13.9,8.15) -13.9,10.15 ; -13.9,-10.15 13.9,-10.15 ; -13.9,-10.15 13.9,-10.15 ; -13.9,-10.15 13.9,-10.15 ; -13.9,10.15 13.9,10.15 ; -13.9,10.15 13.9,10.15 ; -13.9,10.15 13.9,10.15 ; 13.9,-10.15 ccw(c13.9,-8.15) 15.9,-8.15 ; 13.9,-10.15 ccw(c13.9,-8.15) 15.9,-8.15 ; 13.9,-10.15 ccw(c13.9,-8.15) 15.9,-8.15 ; 13.9,10.15 cw(c13.9,8.15) 15.9,8.15 ; 13.9,10.15 cw(c13.9,8.15) 15.9,8.15 ; 13.9,10.15 cw(c13.9,8.15) 15.9,8.15 ; 15.9,-8.15 15.9,8.15 ; 15.9,-8.15 15.9,8.15 ; 15.9,-8.15 15.9,8.15
  text "24" at -13.335,3.81 h1.27
  text "13" at 14.605,3.81 h1.27
  text "12" at 14.605,-5.715 h1.27
  text "1" at -13.335,-5.715 h1.27
Mechanical 15:
  lines w0.05: -16.125,-10.41 -16.125,10.41 16.125,10.41 16.125,-10.41 -16.125,-10.41
3D body "DCDC_XPPOWER_JTB03.stp": height 10.2, standoff -3.8, extent -15.9,-10.15 15.9,10.15

## DIOAD1397W120L700D400 [mm] "Diode, Axial; Lead Spacing 13.97mm, Lead Dia. 1.20mm, Body Length 7mm, Body Dia. 4mm"
height 4
pads (2):
  round 2.2 hole 1.5: 1(-6.985,0) 2(6.985,0)
Top Overlay:
  lines w0.2: -5.608,-0.595 -3.5,-0.595 ; -5.608,0.595 -3.5,0.595 ; -2.5,-2 -2.5,2 ; -2.389,-2 -2.389,2 ; -2.262,-2 -2.262,2 ; -2.135,-2 -2.135,2 ; -2.008,-2 -2.008,2 ; -1.881,-2 -1.881,2 ; -1.754,-2 -1.754,2 ; -1.627,-2 -1.627,2 ; -1.5,-2 -1.5,2 ; 3.5,-0.595 5.608,-0.595 ; 3.5,0.595 5.608,0.595 ; -3.5,-2 -3.5,2 3.5,2 3.5,-2 -3.5,-2
Notvisible:
  lines w0.1: -7.485,0 -6.985,0 ; -6.985,-0.5 -6.985,0 ; -6.985,0.5 -6.985,0 ; -6.485,0 -6.985,0 ; -0.5,0 0,0 ; 0,-0.5 0,0 ; 0,0.5 0,0 ; 0.5,0 0,0 ; 6.485,0 6.985,0 ; 6.985,-0.5 6.985,0 ; 6.985,0.5 6.985,0 ; 7.485,0 6.985,0
Mechanical 14:
  lines w0.1: -3.5,-0.595 -6.985,-0.595 cw(c-6.985,0) -6.985,0.595 -3.5,0.595 ; -2.5,-2 -2.5,2 ; -1.5,-2 -1.5,2 ; 3.5,-0.595 6.985,-0.595 ccw(c6.985,0) 6.985,0.595 3.5,0.595 ; -3.5,-2 -3.5,2 3.5,2 3.5,-2 -3.5,-2
3D body "NTE_NTE506.stp": height 4, standoff -3.6, extent -7.58,-2 7.58,2

## DIOAD2040W125L885D885 [mm] "Diode, Axial; Lead Spacing 20.40mm, Lead Dia. 1.25mm, Body Length 8.85mm, Body Dia. 8.85mm"
height 9.1
pads (2):
  round 2.2 hole 1.5: 1(-10.2,0) 2(10.2,0)
Top Overlay:
  lines w0.2: -8.88,-0.6 -4.55,-0.6 ; -8.88,0.6 -4.55,0.6 ; -3.45,-4.55 -3.45,4.55 ; -3.35,-4.55 -3.35,4.55 ; -3.25,-4.55 -3.25,4.55 ; -3.15,-4.55 -3.15,4.55 ; -3.05,-4.55 -3.05,4.55 ; -2.95,-4.55 -2.95,4.55 ; -2.85,-4.55 -2.85,4.55 ; -2.75,-4.55 -2.75,4.55 ; 4.55,-0.6 8.88,-0.6 ; 4.55,0.6 8.88,0.6 ; -4.55,-4.55 -4.55,4.55 4.55,4.55 4.55,-4.55 -4.55,-4.55
Notvisible:
  lines w0.05: -10.7,0 -10.2,0 ; -10.2,-0.5 -10.2,0 ; -10.2,0.5 -10.2,0 ; -9.7,0 -10.2,0 ; -0.5,0 0,0 ; 0,-0.5 0,0 ; 0,0.5 0,0 ; 0.5,0 0,0 ; 9.7,0 10.2,0 ; 10.2,-0.5 10.2,0 ; 10.2,0.5 10.2,0 ; 10.7,0 10.2,0
Mechanical 14:
  lines w0.1: -4.55,-0.6 -10.2,-0.6 cw(c-10.2,0) -10.2,0.6 -4.55,0.6 ; -3.45,-4.55 -3.45,4.55 ; -3.35,-4.55 -3.35,4.55 ; -3.25,-4.55 -3.25,4.55 ; -3.15,-4.55 -3.15,4.55 ; -3.05,-4.55 -3.05,4.55 ; -2.95,-4.55 -2.95,4.55 ; -2.85,-4.55 -2.85,4.55 ; -2.75,-4.55 -2.75,4.55 ; 4.55,-0.6 10.2,-0.6 ccw(c10.2,0) 10.2,0.6 4.55,0.6 ; -4.55,-4.55 -4.55,4.55 4.55,4.55 4.55,-4.55 -4.55,-4.55
3D body "DIOAD2040W125L885D885.stp": height 9.1, standoff -3.6, extent -10.799,-4.55 10.799,4.55

## DIOAD2500W82L400D360A [mm] "Diode, Axial; Lead Spacing 25.00mm, Lead Dia. 0.82mm, Body Length 4.00mm, Body Dia. 3.60mm, Standoff Height 1.4mm"
height 4.6
pads (2):
  round 1.6 hole 1.1: 1(-12.5,0) 2(12.5,0)
Top Overlay:
  lines w0.2: -8.621,-0.4 -2.28,-0.4 ; -8.621,0.4 -2.28,0.4 ; -1.474,-1.244 -1.474,1.244 ; -1.274,-1.41 -1.274,1.41 ; -1.074,-1.568 -1.074,1.568 ; -0.874,-1.689 -0.874,1.689 ; 8.621,-0.4 2.28,-0.4 ; 8.621,0.4 2.28,0.4 ; -2.28,-0.4 ccw(c-1.512,-0.28) -1.883,-0.962 cw(c-2.839,-2.719) -1.681,-1.089 cw(c-4.575,-5.166) -1.26,-1.423 ccw(c0,0) -0.92,-1.663 -0.813,-1.723 ccw(c0,0) 0,-1.905 ccw(c0,0) 0.813,-1.723 0.92,-1.663 ccw(c0,0) 1.26,-1.423 cw(c4.575,-5.166) 1.681,-1.089 cw(c2.839,-2.719) 1.883,-0.962 ccw(c1.512,-0.28) 2.28,-0.4 ; -2.28,-0.4 -2.28,0 -2.28,0.4 ; -2.28,0.4 cw(c-1.512,0.28) -1.883,0.962 ccw(c-2.839,2.719) -1.681,1.089 ccw(c-4.575,5.166) -1.26,1.423 cw(c0,0) -0.92,1.663 -0.813,1.723 cw(c0,0) 0,1.905 cw(c0,0) 0.813,1.723 0.92,1.663 cw(c0,0) 1.26,1.423 ccw(c4.575,5.166) 1.681,1.089 ccw(c2.839,2.719) 1.883,0.962 cw(c1.512,0.28) 2.28,0.4 ; 2.28,-0.4 2.28,0 2.28,0.4
Notvisible:
  lines w0.1: -13.5,0 -12.5,0 ; -12.5,-1 -12.5,0 ; -12.5,1 -12.5,0 ; -11.5,0 -12.5,0 ; -1,0 0,0 ; 0,-1 0,0 ; 0,1 0,0 ; 1,0 0,0 ; 11.5,0 12.5,0 ; 12.5,-1 12.5,0 ; 12.5,1 12.5,0 ; 13.5,0 12.5,0
Mechanical 14:
  lines w0.1: -12.123,-0.4 cw(c-12.5,0) -12.123,0.4 ; -11.807,-0.4 cw(c-12.5,0) -11.807,0.4 ; -1.474,-1.244 -1.474,1.244 ; -1.274,-1.41 -1.274,1.41 ; -1.074,-1.568 -1.074,1.568 ; -0.874,-1.689 -0.874,1.689 ; 11.807,-0.4 ccw(c12.5,0) 11.807,0.4 ; 12.123,-0.4 ccw(c12.5,0) 12.123,0.4 ; -2.28,-0.4 ccw(c-1.512,-0.28) -1.883,-0.962 cw(c-2.839,-2.719) -1.681,-1.089 cw(c-4.575,-5.166) -1.26,-1.423 ccw(c0,0) -0.92,-1.663 -0.813,-1.723 ccw(c0,0) 0,-1.905 ccw(c0,0) 0.813,-1.723 0.92,-1.663 ccw(c0,0) 1.26,-1.423 cw(c4.575,-5.166) 1.681,-1.089 cw(c2.839,-2.719) 1.883,-0.962 ccw(c1.512,-0.28) 2.28,-0.4 ; -2.28,-0.4 -12.5,-0.4 cw(c-12.5,0) -12.5,0.4 -2.28,0.4 ; -2.28,-0.4 -2.28,0 -2.28,0.4 ; -2.28,0.4 cw(c-1.512,0.28) -1.883,0.962 ccw(c-2.839,2.719) -1.681,1.089 ccw(c-4.575,5.166) -1.26,1.423 cw(c0,0) -0.92,1.663 -0.813,1.723 cw(c0,0) 0,1.905 cw(c0,0) 0.813,1.723 0.92,1.663 cw(c0,0) 1.26,1.423 ccw(c4.575,5.166) 1.681,1.089 ccw(c2.839,2.719) 1.883,0.962 cw(c1.512,0.28) 2.28,0.4 ; 2.28,-0.4 12.5,-0.4 ccw(c12.5,0) 12.5,0.4 2.28,0.4 ; 2.28,-0.4 2.28,0 2.28,0.4
3D body "DIOAD2500W82L400D360H460A.stp": height 4.9, standoff -3, extent -12.9,-1.905 12.9,1.905

## DIP4-300 [mm] "DIP 4 Leads, Row Spacing 7.62 mm; Pitch 2.54 mm"
height 5.08
pads (4):
  rect 1.6x1.5 hole 0.9: 1(-3.81,1.27)
  oval 1.6x1.5 hole 0.9: 2(-3.81,-1.27) 3(3.81,-1.27) 4(3.81,1.27)
Top Overlay:
  lines w0.2: -0.635,2.61 ccw(c0,2.61) 0.635,2.61 ; -0.635,2.61 ccw(c0,2.61) 0.635,2.61 ; -0.635,2.61 -2.65,2.61 -2.65,-2.61 2.65,-2.61 2.65,2.61 0.635,2.61
Mechanical 14:
  circle w0.1: c-1.905,1.27 r0.254
  lines w0.1: -3.3,-2.61 3.3,-2.61 3.3,2.61 0.635,2.61 cw(c0,2.61) -0.635,2.61 -3.3,2.61 -3.3,-2.61
3D body "DIP4-300.stp": height 5.33, standoff -3.3, extent -3.935,-2.54 3.935,2.54

## DIP6-300 [mm] "DIP 6 Leads, Row Spacing 7.62 mm; Pitch 2.54 mm"
height 5.08
pads (6):
  rect 1.6x1.6 hole 0.9: 1(-3.81,2.54)
  round 1.6 hole 0.9: 2(-3.81,0) 3(-3.81,-2.54) 4(3.81,-2.54) 5(3.81,0) 6(3.81,2.54)
Top Overlay:
  lines w0.2: -0.635,3.88 ccw(c0,3.88) 0.635,3.88 ; -0.635,3.88 ccw(c0,3.88) 0.635,3.88 ; -0.635,3.88 -2.65,3.88 -2.65,-3.88 2.65,-3.88 2.65,3.88 0.635,3.88
Mechanical 14:
  circle w0.1: c-1.905,2.54 r0.254
  lines w0.1: -3.3,-3.88 -3.3,3.88 -0.635,3.88 ccw(c0,3.88) 0.635,3.88 3.3,3.88 3.3,-3.88 -3.3,-3.88
3D body "DIP6-300.stp": height 5.33, standoff -3.3, extent -3.935,-3.81 3.935,3.81

## DIP6-300_4 [mm] "DIP 6, 4 Leads, Row Spacing 7.62 mm; Pitch 2.54 mm"
height 5.08
pads (4):
  rect 1.6x1.6 hole 0.9: 1(-3.81,2.54)
  round 1.6 hole 0.9: 3(-3.81,-2.54) 4(3.81,-2.54) 6(3.81,2.54)
Top Overlay:
  lines w0.2: -0.635,3.88 ccw(c0,3.88) 0.635,3.88 ; -0.635,3.88 ccw(c0,3.88) 0.635,3.88 ; -0.635,3.88 -2.65,3.88 -2.65,-3.88 2.65,-3.88 2.65,3.88 0.635,3.88
Mechanical 14:
  circle w0.1: c-1.905,2.54 r0.254
  lines w0.1: -3.3,-3.88 -3.3,3.88 -0.67,3.88 ccw(c-0.035,3.88) 0.6,3.88 3.3,3.88 3.3,-3.88 -3.3,-3.88
3D body "DIP6-300_4.stp": height 5.33, standoff -3.3, extent -3.935,-3.81 3.935,3.81